# Altium footprint library Molex FFC - FPC Connectors (SMT).PcbLib: 638 footprints (part 18 of 40)
Each footprint in its own frame and in the unit in brackets; x right, y up, seen from the top. Pads: shape width x height; smd on the part's side, far side on the other; paste and mask are expansions set on the pad; w line width, h text height; cw(c..) or ccw(c..) is an arc to the next point about the centre after c.
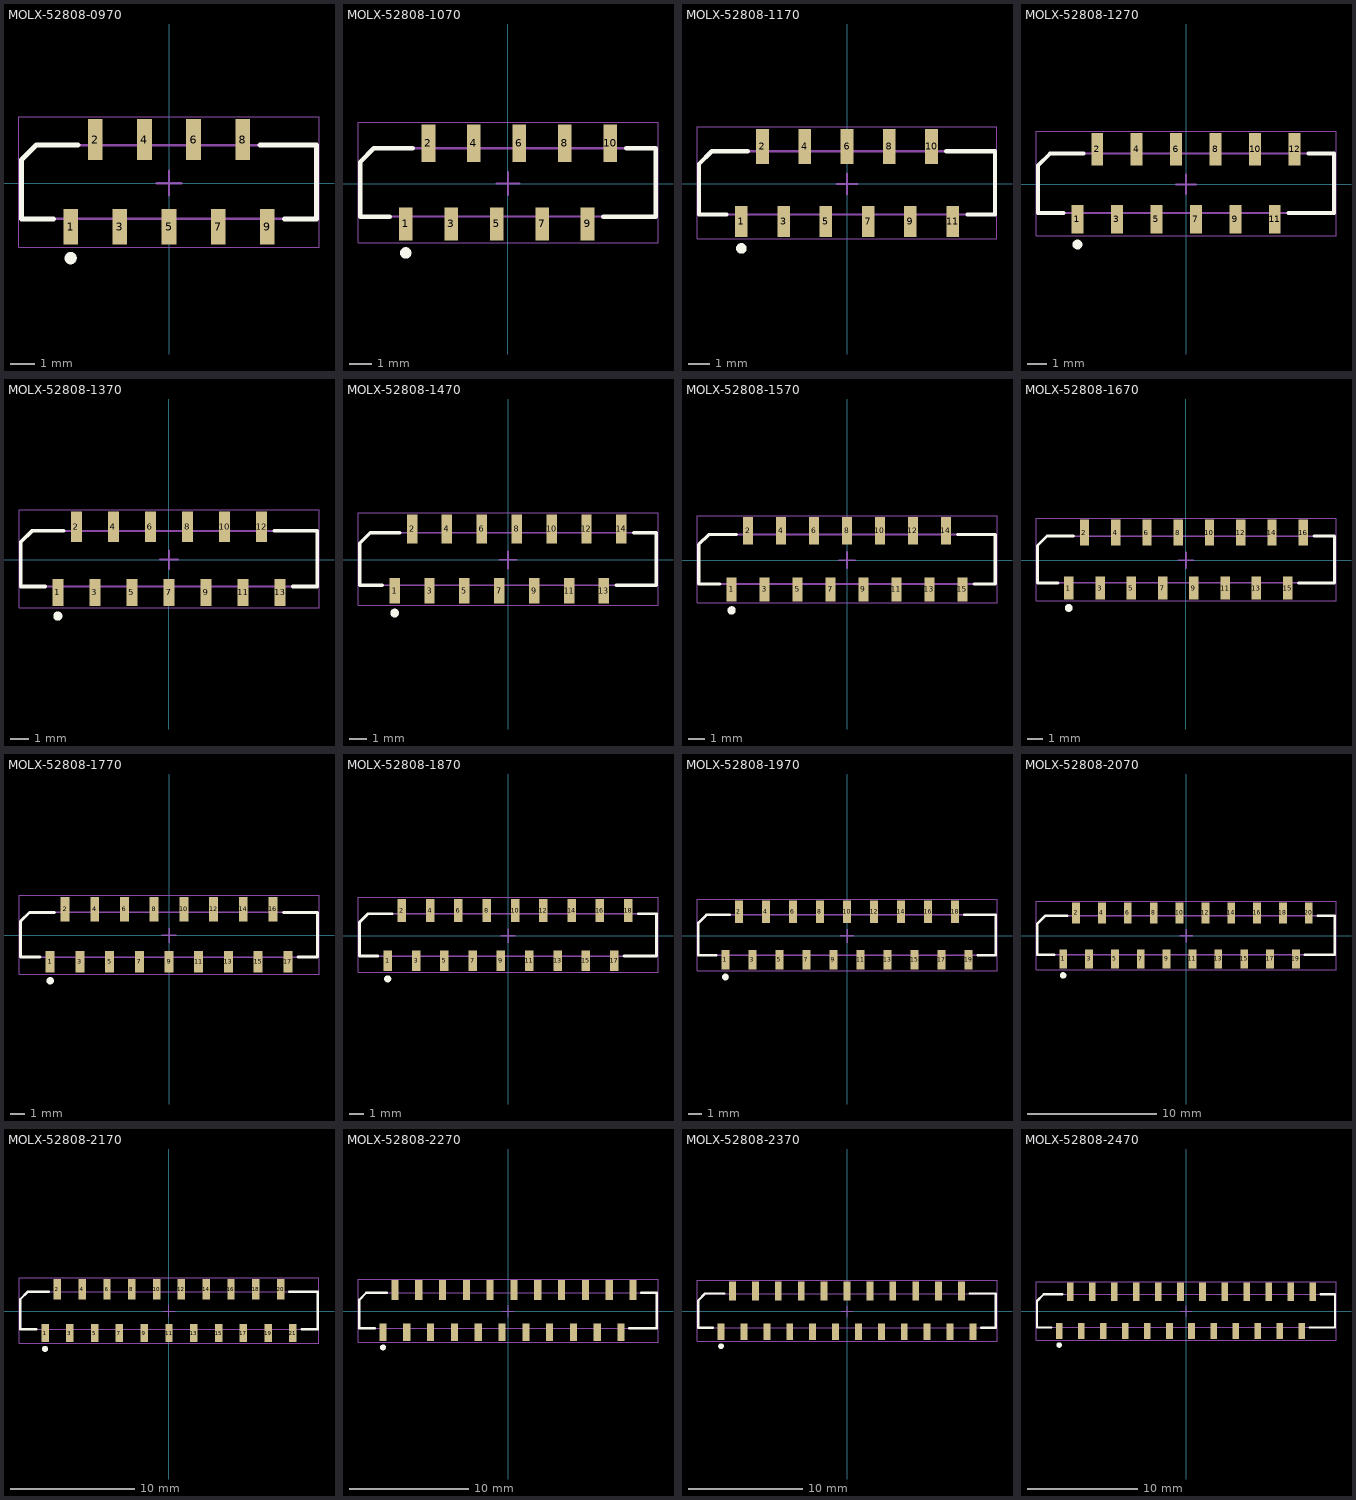
[diagram p17: the footprints below, top view; thin cyan lines are the x and y axes]

## MOLX-52808-0970 [mm] "FFC Connector, 9-Leads, Vertical, Pitch 1.0 mm, Mated Height 5.05 mm, SMT"
height 5.112
pads (9):
  rect 0.6x1.45 smd: 1(-4,-1.775) 3(-2,-1.775) 5(0,-1.775) 7(2,-1.775) 9(4,-1.775)
  rect 0.6x1.65 smd: 2(-3,1.775) 4(-1,1.775) 6(1,1.775) 8(3,1.775)
Top Overlay:
  circle w0.25: c-4,-3.05 r0.125
  lines w0.2: -4.7,-1.45 -6,-1.45 -6,0.95 -5.4,1.55 -3.7,1.55 ; 3.7,1.55 6,1.55 6,-1.45 4.7,-1.45
Mechanical 13:
  lines w0.1: -6,-1.45 -6,0.95 -5.4,1.55 6,1.55 6,-1.45 -6,-1.45
Mechanical 15:
  lines w0.05: -6.1,-2.6 -6.1,2.7 6.1,2.7 6.1,-2.6 -6.1,-2.6
  lines w0.1: -0.5,0 0.5,0 ; 0,-0.5 0,0.5
3D body: height 0.25, standoff 0, extent -6,-2.2 6,2.3

## MOLX-52808-1070 [mm] "FFC Connector, 10-Leads, Vertical, Pitch 1.0 mm, Mated Height 5.05 mm, SMT"
height 5.112
pads (10):
  rect 0.6x1.45 smd: 1(-4.5,-1.775) 3(-2.5,-1.775) 5(-0.5,-1.775) 7(1.5,-1.775) 9(3.5,-1.775)
  rect 0.6x1.65 smd: 2(-3.5,1.775) 4(-1.5,1.775) 6(0.5,1.775) 8(2.5,1.775) 10(4.5,1.775)
Top Overlay:
  circle w0.25: c-4.5,-3.05 r0.125
  lines w0.2: -5.2,-1.45 -6.5,-1.45 -6.5,0.95 -5.9,1.55 -4.2,1.55 ; 4.2,-1.45 6.5,-1.45 6.5,1.55 5.2,1.55
Mechanical 13:
  lines w0.1: -6.5,-1.45 -6.5,0.95 -5.9,1.55 6.5,1.55 6.5,-1.45 -6.5,-1.45
Mechanical 15:
  lines w0.05: -6.6,-2.6 -6.6,2.7 6.6,2.7 6.6,-2.6 -6.6,-2.6
  lines w0.1: -0.5,0 0.5,0 ; 0,-0.5 0,0.5
3D body: height 0.25, standoff 0, extent -6.5,-2.2 6.5,2.3

## MOLX-52808-1170 [mm] "FFC Connector, 11-Leads, Vertical, Pitch 1.0 mm, Mated Height 5.05 mm, SMT"
height 5.112
pads (11):
  rect 0.6x1.45 smd: 1(-5,-1.775) 3(-3,-1.775) 5(-1,-1.775) 7(1,-1.775) 9(3,-1.775) 11(5,-1.775)
  rect 0.6x1.65 smd: 2(-4,1.775) 4(-2,1.775) 6(0,1.775) 8(2,1.775) 10(4,1.775)
Top Overlay:
  circle w0.25: c-5,-3.05 r0.125
  lines w0.2: -5.7,-1.45 -7,-1.45 -7,0.95 -6.4,1.55 -4.7,1.55 ; 4.7,1.55 7,1.55 7,-1.45 5.7,-1.45
Mechanical 13:
  lines w0.1: -7,-1.45 -7,0.95 -6.4,1.55 7,1.55 7,-1.45 -7,-1.45
Mechanical 15:
  lines w0.05: -7.1,-2.6 -7.1,2.7 7.1,2.7 7.1,-2.6 -7.1,-2.6
  lines w0.1: -0.5,0 0.5,0 ; 0,-0.5 0,0.5
3D body: height 0.25, standoff 0, extent -7,-2.2 7,2.3

## MOLX-52808-1270 [mm] "FFC Connector, 12-Leads, Vertical, Pitch 1.0 mm, Mated Height 5.05 mm, SMT"
height 5.112
pads (12):
  rect 0.6x1.45 smd: 1(-5.5,-1.775) 3(-3.5,-1.775) 5(-1.5,-1.775) 7(0.5,-1.775) 9(2.5,-1.775) 11(4.5,-1.775)
  rect 0.6x1.65 smd: 2(-4.5,1.775) 4(-2.5,1.775) 6(-0.5,1.775) 8(1.5,1.775) 10(3.5,1.775) 12(5.5,1.775)
Top Overlay:
  circle w0.25: c-5.5,-3.05 r0.125
  lines w0.2: -6.2,-1.45 -7.5,-1.45 -7.5,0.95 -6.9,1.55 -5.2,1.55 ; 5.2,-1.45 7.5,-1.45 7.5,1.55 6.2,1.55
Mechanical 13:
  lines w0.1: -7.5,-1.45 7.5,-1.45 7.5,1.55 -6.9,1.55 -7.5,0.95 -7.5,-1.45
Mechanical 15:
  lines w0.05: -7.6,-2.6 7.6,-2.6 7.6,2.7 -7.6,2.7 -7.6,-2.6
  lines w0.1: -0.5,0 0.5,0 ; 0,-0.5 0,0.5
3D body: height 0.25, standoff 0, extent -7.5,-2.2 7.5,2.3

## MOLX-52808-1370 [mm] "FFC Connector, 13-Leads, Vertical, Pitch 1.0 mm, Mated Height 5.05 mm, SMT"
height 5.112
pads (13):
  rect 0.6x1.45 smd: 1(-6,-1.775) 3(-4,-1.775) 5(-2,-1.775) 7(0,-1.775) 9(2,-1.775) 11(4,-1.775) 13(6,-1.775)
  rect 0.6x1.65 smd: 2(-5,1.775) 4(-3,1.775) 6(-1,1.775) 8(1,1.775) 10(3,1.775) 12(5,1.775)
Top Overlay:
  circle w0.25: c-6,-3.05 r0.125
  lines w0.2: -6.7,-1.45 -8,-1.45 -8,0.95 -7.4,1.55 -5.7,1.55 ; 5.7,1.55 8,1.55 8,-1.45 6.7,-1.45
Mechanical 13:
  lines w0.1: -8,-1.45 8,-1.45 8,1.55 -7.4,1.55 -8,0.95 -8,-1.45
Mechanical 15:
  lines w0.05: -8.1,-2.6 8.1,-2.6 8.1,2.7 -8.1,2.7 -8.1,-2.6
  lines w0.1: -0.5,0 0.5,0 ; 0,-0.5 0,0.5
3D body: height 0.25, standoff 0, extent -8,-2.2 8,2.3

## MOLX-52808-1470 [mm] "FFC Connector, 14-Leads, Vertical, Pitch 1.0 mm, Mated Height 5.05 mm, SMT"
height 5.112
pads (14):
  rect 0.6x1.45 smd: 1(-6.5,-1.775) 3(-4.5,-1.775) 5(-2.5,-1.775) 7(-0.5,-1.775) 9(1.5,-1.775) 11(3.5,-1.775) 13(5.5,-1.775)
  rect 0.6x1.65 smd: 2(-5.5,1.775) 4(-3.5,1.775) 6(-1.5,1.775) 8(0.5,1.775) 10(2.5,1.775) 12(4.5,1.775) 14(6.5,1.775)
Top Overlay:
  circle w0.25: c-6.5,-3.05 r0.125
  lines w0.2: -7.2,-1.45 -8.5,-1.45 -8.5,0.95 -7.9,1.55 -6.2,1.55 ; 6.2,-1.45 8.5,-1.45 8.5,1.55 7.2,1.55
Mechanical 13:
  lines w0.1: -8.5,-1.45 8.5,-1.45 8.5,1.55 -7.9,1.55 -8.5,0.95 -8.5,-1.45
Mechanical 15:
  lines w0.05: -8.6,-2.6 8.6,-2.6 8.6,2.7 -8.6,2.7 -8.6,-2.6
  lines w0.1: -0.5,0 0.5,0 ; 0,-0.5 0,0.5
3D body: height 0.25, standoff 0, extent -8.5,-2.2 8.5,2.3

## MOLX-52808-1570 [mm] "FFC Connector, 15-Leads, Vertical, Pitch 1.0 mm, Mated Height 5.05 mm, SMT"
height 5.112
pads (15):
  rect 0.6x1.45 smd: 1(-7,-1.775) 3(-5,-1.775) 5(-3,-1.775) 7(-1,-1.775) 9(1,-1.775) 11(3,-1.775) 13(5,-1.775) 15(7,-1.775)
  rect 0.6x1.65 smd: 2(-6,1.775) 4(-4,1.775) 6(-2,1.775) 8(0,1.775) 10(2,1.775) 12(4,1.775) 14(6,1.775)
Top Overlay:
  circle w0.25: c-7,-3.05 r0.125
  lines w0.2: -7.7,-1.45 -9,-1.45 -9,0.95 -8.4,1.55 -6.7,1.55 ; 6.7,1.55 9,1.55 9,-1.45 7.7,-1.45
Mechanical 13:
  lines w0.1: -9,-1.45 9,-1.45 9,1.55 -8.4,1.55 -9,0.95 -9,-1.45
Mechanical 15:
  lines w0.05: -9.1,-2.6 9.1,-2.6 9.1,2.7 -9.1,2.7 -9.1,-2.6
  lines w0.1: -0.5,0 0.5,0 ; 0,-0.5 0,0.5
3D body: height 0.25, standoff 0, extent -9,-2.2 9,2.3

## MOLX-52808-1670 [mm] "FFC Connector, 16-Leads, Vertical, Pitch 1.0 mm, Mated Height 5.05 mm, SMT"
height 5.112
pads (16):
  rect 0.6x1.45 smd: 1(-7.5,-1.775) 3(-5.5,-1.775) 5(-3.5,-1.775) 7(-1.5,-1.775) 9(0.5,-1.775) 11(2.5,-1.775) 13(4.5,-1.775) 15(6.5,-1.775)
  rect 0.6x1.65 smd: 2(-6.5,1.775) 4(-4.5,1.775) 6(-2.5,1.775) 8(-0.5,1.775) 10(1.5,1.775) 12(3.5,1.775) 14(5.5,1.775) 16(7.5,1.775)
Top Overlay:
  circle w0.25: c-7.5,-3.05 r0.125
  lines w0.2: -8.2,-1.45 -9.5,-1.45 -9.5,0.95 -8.9,1.55 -7.2,1.55 ; 7.2,-1.45 9.5,-1.45 9.5,1.55 8.2,1.55
Mechanical 13:
  lines w0.1: -9.5,-1.45 9.5,-1.45 9.5,1.55 -8.9,1.55 -9.5,0.95 -9.5,-1.45
Mechanical 15:
  lines w0.05: -9.6,-2.6 9.6,-2.6 9.6,2.7 -9.6,2.7 -9.6,-2.6
  lines w0.1: -0.5,0 0.5,0 ; 0,-0.5 0,0.5
3D body: height 0.25, standoff 0, extent -9.5,-2.2 9.5,2.3

## MOLX-52808-1770 [mm] "FFC Connector, 17-Leads, Vertical, Pitch 1.0 mm, Mated Height 5.05 mm, SMT"
height 5.112
pads (17):
  rect 0.6x1.45 smd: 1(-8,-1.775) 3(-6,-1.775) 5(-4,-1.775) 7(-2,-1.775) 9(0,-1.775) 11(2,-1.775) 13(4,-1.775) 15(6,-1.775) 17(8,-1.775)
  rect 0.6x1.65 smd: 2(-7,1.775) 4(-5,1.775) 6(-3,1.775) 8(-1,1.775) 10(1,1.775) 12(3,1.775) 14(5,1.775) 16(7,1.775)
Top Overlay:
  circle w0.25: c-8,-3.05 r0.125
  lines w0.2: -8.7,-1.45 -10,-1.45 -10,0.95 -9.4,1.55 -7.7,1.55 ; 7.7,1.55 10,1.55 10,-1.45 8.7,-1.45
Mechanical 13:
  lines w0.1: -10,-1.45 10,-1.45 10,1.55 -9.4,1.55 -10,0.95 -10,-1.45
Mechanical 15:
  lines w0.05: -10.1,-2.6 10.1,-2.6 10.1,2.7 -10.1,2.7 -10.1,-2.6
  lines w0.1: -0.5,0 0.5,0 ; 0,-0.5 0,0.5
3D body: height 0.25, standoff 0, extent -10,-2.2 10,2.3

## MOLX-52808-1870 [mm] "FFC Connector, 18-Leads, Vertical, Pitch 1.0 mm, Mated Height 5.05 mm, SMT"
height 5.112
pads (18):
  rect 0.6x1.45 smd: 1(-8.5,-1.775) 3(-6.5,-1.775) 5(-4.5,-1.775) 7(-2.5,-1.775) 9(-0.5,-1.775) 11(1.5,-1.775) 13(3.5,-1.775) 15(5.5,-1.775) 17(7.5,-1.775)
  rect 0.6x1.65 smd: 2(-7.5,1.775) 4(-5.5,1.775) 6(-3.5,1.775) 8(-1.5,1.775) 10(0.5,1.775) 12(2.5,1.775) 14(4.5,1.775) 16(6.5,1.775) 18(8.5,1.775)
Top Overlay:
  circle w0.25: c-8.5,-3.05 r0.125
  lines w0.2: -9.2,-1.45 -10.5,-1.45 -10.5,0.95 -9.9,1.55 -8.2,1.55 ; 8.2,-1.45 10.5,-1.45 10.5,1.55 9.2,1.55
Mechanical 13:
  lines w0.1: -10.5,-1.45 10.5,-1.45 10.5,1.55 -9.9,1.55 -10.5,0.95 -10.5,-1.45
Mechanical 15:
  lines w0.05: -10.6,-2.6 10.6,-2.6 10.6,2.7 -10.6,2.7 -10.6,-2.6
  lines w0.1: -0.5,0 0.5,0 ; 0,-0.5 0,0.5
3D body: height 0.25, standoff 0, extent -10.5,-2.2 10.5,2.3

## MOLX-52808-1970 [mm] "FFC Connector, 19-Leads, Vertical, Pitch 1.0 mm, Mated Height 5.05 mm, SMT"
height 5.112
pads (19):
  rect 0.6x1.45 smd: 1(-9,-1.775) 3(-7,-1.775) 5(-5,-1.775) 7(-3,-1.775) 9(-1,-1.775) 11(1,-1.775) 13(3,-1.775) 15(5,-1.775) 17(7,-1.775) 19(9,-1.775)
  rect 0.6x1.65 smd: 2(-8,1.775) 4(-6,1.775) 6(-4,1.775) 8(-2,1.775) 10(0,1.775) 12(2,1.775) 14(4,1.775) 16(6,1.775) 18(8,1.775)
Top Overlay:
  circle w0.25: c-9,-3.05 r0.125
  lines w0.2: -9.7,-1.45 -11,-1.45 -11,0.95 -10.4,1.55 -8.7,1.55 ; 8.7,1.55 11,1.55 11,-1.45 9.7,-1.45
Mechanical 13:
  lines w0.1: -11,-1.45 11,-1.45 11,1.55 -10.4,1.55 -11,0.95 -11,-1.45
Mechanical 15:
  lines w0.05: -11.1,-2.6 11.1,-2.6 11.1,2.7 -11.1,2.7 -11.1,-2.6
  lines w0.1: -0.5,0 0.5,0 ; 0,-0.5 0,0.5
3D body: height 0.25, standoff 0, extent -11,-2.2 11,2.3

## MOLX-52808-2070 [mm] "FFC Connector, 20-Leads, Vertical, Pitch 1.0 mm, Mated Height 5.05 mm, SMT"
height 5.112
pads (20):
  rect 0.6x1.45 smd: 1(-9.5,-1.775) 3(-7.5,-1.775) 5(-5.5,-1.775) 7(-3.5,-1.775) 9(-1.5,-1.775) 11(0.5,-1.775) 13(2.5,-1.775) 15(4.5,-1.775) 17(6.5,-1.775) 19(8.5,-1.775)
  rect 0.6x1.65 smd: 2(-8.5,1.775) 4(-6.5,1.775) 6(-4.5,1.775) 8(-2.5,1.775) 10(-0.5,1.775) 12(1.5,1.775) 14(3.5,1.775) 16(5.5,1.775) 18(7.5,1.775) 20(9.5,1.775)
Top Overlay:
  circle w0.25: c-9.5,-3.05 r0.125
  lines w0.2: -10.2,-1.45 -11.5,-1.45 -11.5,0.95 -10.9,1.55 -9.2,1.55 ; 9.2,-1.45 11.5,-1.45 11.5,1.55 10.2,1.55
Mechanical 13:
  lines w0.1: -11.5,-1.45 11.5,-1.45 11.5,1.55 -10.9,1.55 -11.5,0.95 -11.5,-1.45
Mechanical 15:
  lines w0.05: -11.6,-2.6 11.6,-2.6 11.6,2.7 -11.6,2.7 -11.6,-2.6
  lines w0.1: -0.492,0 0.508,0 ; 0.008,-0.5 0.008,0.5
3D body: height 0.25, standoff 0, extent -11.5,-2.2 11.5,2.3

## MOLX-52808-2170 [mm] "FFC Connector, 21-Leads, Vertical, Pitch 1.0 mm, Mated Height 5.05 mm, SMT"
height 5.112
pads (21):
  rect 0.6x1.45 smd: 1(-10,-1.775) 3(-8,-1.775) 5(-6,-1.775) 7(-4,-1.775) 9(-2,-1.775) 11(0,-1.775) 13(2,-1.775) 15(4,-1.775) 17(6,-1.775) 19(8,-1.775) 21(10,-1.775)
  rect 0.6x1.65 smd: 2(-9,1.775) 4(-7,1.775) 6(-5,1.775) 8(-3,1.775) 10(-1,1.775) 12(1,1.775) 14(3,1.775) 16(5,1.775) 18(7,1.775) 20(9,1.775)
Top Overlay:
  circle w0.25: c-10,-3.05 r0.125
  lines w0.2: -10.7,-1.45 -12,-1.45 -12,0.95 -11.4,1.55 -9.7,1.55 ; 9.7,1.55 12,1.55 12,-1.45 10.7,-1.45
Mechanical 13:
  lines w0.1: -12,-1.45 12,-1.45 12,1.55 -11.4,1.55 -12,0.95 -12,-1.45
Mechanical 15:
  lines w0.05: -12.1,-2.6 12.1,-2.6 12.1,2.7 -12.1,2.7 -12.1,-2.6
  lines w0.1: -0.5,0 0.5,0 ; 0,-0.5 0,0.5
3D body: height 0.25, standoff 0, extent -12,-2.2 12,2.3

## MOLX-52808-2270 [mm] "FFC Connector, 22-Leads, Vertical, Pitch 1.0 mm, Mated Height 5.05 mm, SMT"
height 5.112
pads (22):
  rect 0.6x1.45 smd: 1(-10.5,-1.775) 3(-8.5,-1.775) 5(-6.5,-1.775) 7(-4.5,-1.775) 9(-2.5,-1.775) 11(-0.5,-1.775) 13(1.5,-1.775) 15(3.5,-1.775) 17(5.5,-1.775) 19(7.5,-1.775) 21(9.5,-1.775)
  rect 0.6x1.65 smd: 2(-9.5,1.775) 4(-7.5,1.775) 6(-5.5,1.775) 8(-3.5,1.775) 10(-1.5,1.775) 12(0.5,1.775) 14(2.5,1.775) 16(4.5,1.775) 18(6.5,1.775) 20(8.5,1.775) 22(10.5,1.775)
Top Overlay:
  circle w0.25: c-10.5,-3.05 r0.125
  lines w0.2: -11.2,-1.45 -12.5,-1.45 -12.5,0.95 -11.9,1.55 -10.2,1.55 ; 10.2,-1.45 12.5,-1.45 12.5,1.55 11.2,1.55
Mechanical 13:
  lines w0.1: -12.5,-1.45 12.5,-1.45 12.5,1.55 -11.9,1.55 -12.5,0.95 -12.5,-1.45
Mechanical 15:
  lines w0.05: -12.6,-2.6 12.6,-2.6 12.6,2.7 -12.6,2.7 -12.6,-2.6
  lines w0.1: -0.5,0 0.5,0 ; 0,-0.5 0,0.5
3D body: height 0.25, standoff 0, extent -12.5,-2.2 12.5,2.3

## MOLX-52808-2370 [mm] "FFC Connector, 23-Leads, Vertical, Pitch 1.0 mm, Mated Height 5.05 mm, SMT"
height 5.112
pads (23):
  rect 0.6x1.45 smd: 1(-11,-1.775) 3(-9,-1.775) 5(-7,-1.775) 7(-5,-1.775) 9(-3,-1.775) 11(-1,-1.775) 13(1,-1.775) 15(3,-1.775) 17(5,-1.775) 19(7,-1.775) 21(9,-1.775) 23(11,-1.775)
  rect 0.6x1.65 smd: 2(-10,1.775) 4(-8,1.775) 6(-6,1.775) 8(-4,1.775) 10(-2,1.775) 12(0,1.775) 14(2,1.775) 16(4,1.775) 18(6,1.775) 20(8,1.775) 22(10,1.775)
Top Overlay:
  circle w0.25: c-11,-3.05 r0.125
  lines w0.2: -11.7,-1.45 -13,-1.45 -13,0.95 -12.4,1.55 -10.7,1.55 ; 10.7,1.55 13,1.55 13,-1.45 11.7,-1.45
Mechanical 13:
  lines w0.1: -13,-1.45 13,-1.45 13,1.55 -12.4,1.55 -13,0.95 -13,-1.45
Mechanical 15:
  lines w0.05: -13.1,-2.6 13.1,-2.6 13.1,2.7 -13.1,2.7 -13.1,-2.6
  lines w0.1: -0.5,0 0.5,0 ; 0,-0.5 0,0.5
3D body: height 0.25, standoff 0, extent -13,-2.2 13,2.3

## MOLX-52808-2470 [mm] "FFC Connector, 24-Leads, Vertical, Pitch 1.0 mm, Mated Height 5.05 mm, SMT"
height 5.112
pads (24):
  rect 0.6x1.45 smd: 1(-11.5,-1.775) 3(-9.5,-1.775) 5(-7.5,-1.775) 7(-5.5,-1.775) 9(-3.5,-1.775) 11(-1.5,-1.775) 13(0.5,-1.775) 15(2.5,-1.775) 17(4.5,-1.775) 19(6.5,-1.775) 21(8.5,-1.775) 23(10.5,-1.775)
  rect 0.6x1.65 smd: 2(-10.5,1.775) 4(-8.5,1.775) 6(-6.5,1.775) 8(-4.5,1.775) 10(-2.5,1.775) 12(-0.5,1.775) 14(1.5,1.775) 16(3.5,1.775) 18(5.5,1.775) 20(7.5,1.775) 22(9.5,1.775) 24(11.5,1.775)
Top Overlay:
  circle w0.25: c-11.5,-3.05 r0.125
  lines w0.2: -12.2,-1.45 -13.5,-1.45 -13.5,0.95 -12.9,1.55 -11.2,1.55 ; 11.2,-1.45 13.5,-1.45 13.5,1.55 12.2,1.55
Mechanical 13:
  lines w0.1: -13.5,-1.45 13.5,-1.45 13.5,1.55 -12.9,1.55 -13.5,0.95 -13.5,-1.45
Mechanical 15:
  lines w0.05: -13.6,-2.6 13.6,-2.6 13.6,2.7 -13.6,2.7 -13.6,-2.6
  lines w0.1: -0.5,0 0.5,0 ; 0,-0.5 0,0.5
3D body: height 0.25, standoff 0, extent -13.5,-2.2 13.5,2.3